# Altium footprint library PCB2-v2.PcbLib: 29 footprints (part 2 of 2)
Each footprint in its own frame and in the unit in brackets; x right, y up, seen from the top. Pads: shape width x height; smd on the part's side, far side on the other; paste and mask are expansions set on the pad; w line width, h text height; cw(c..) or ccw(c..) is an arc to the next point about the centre after c.
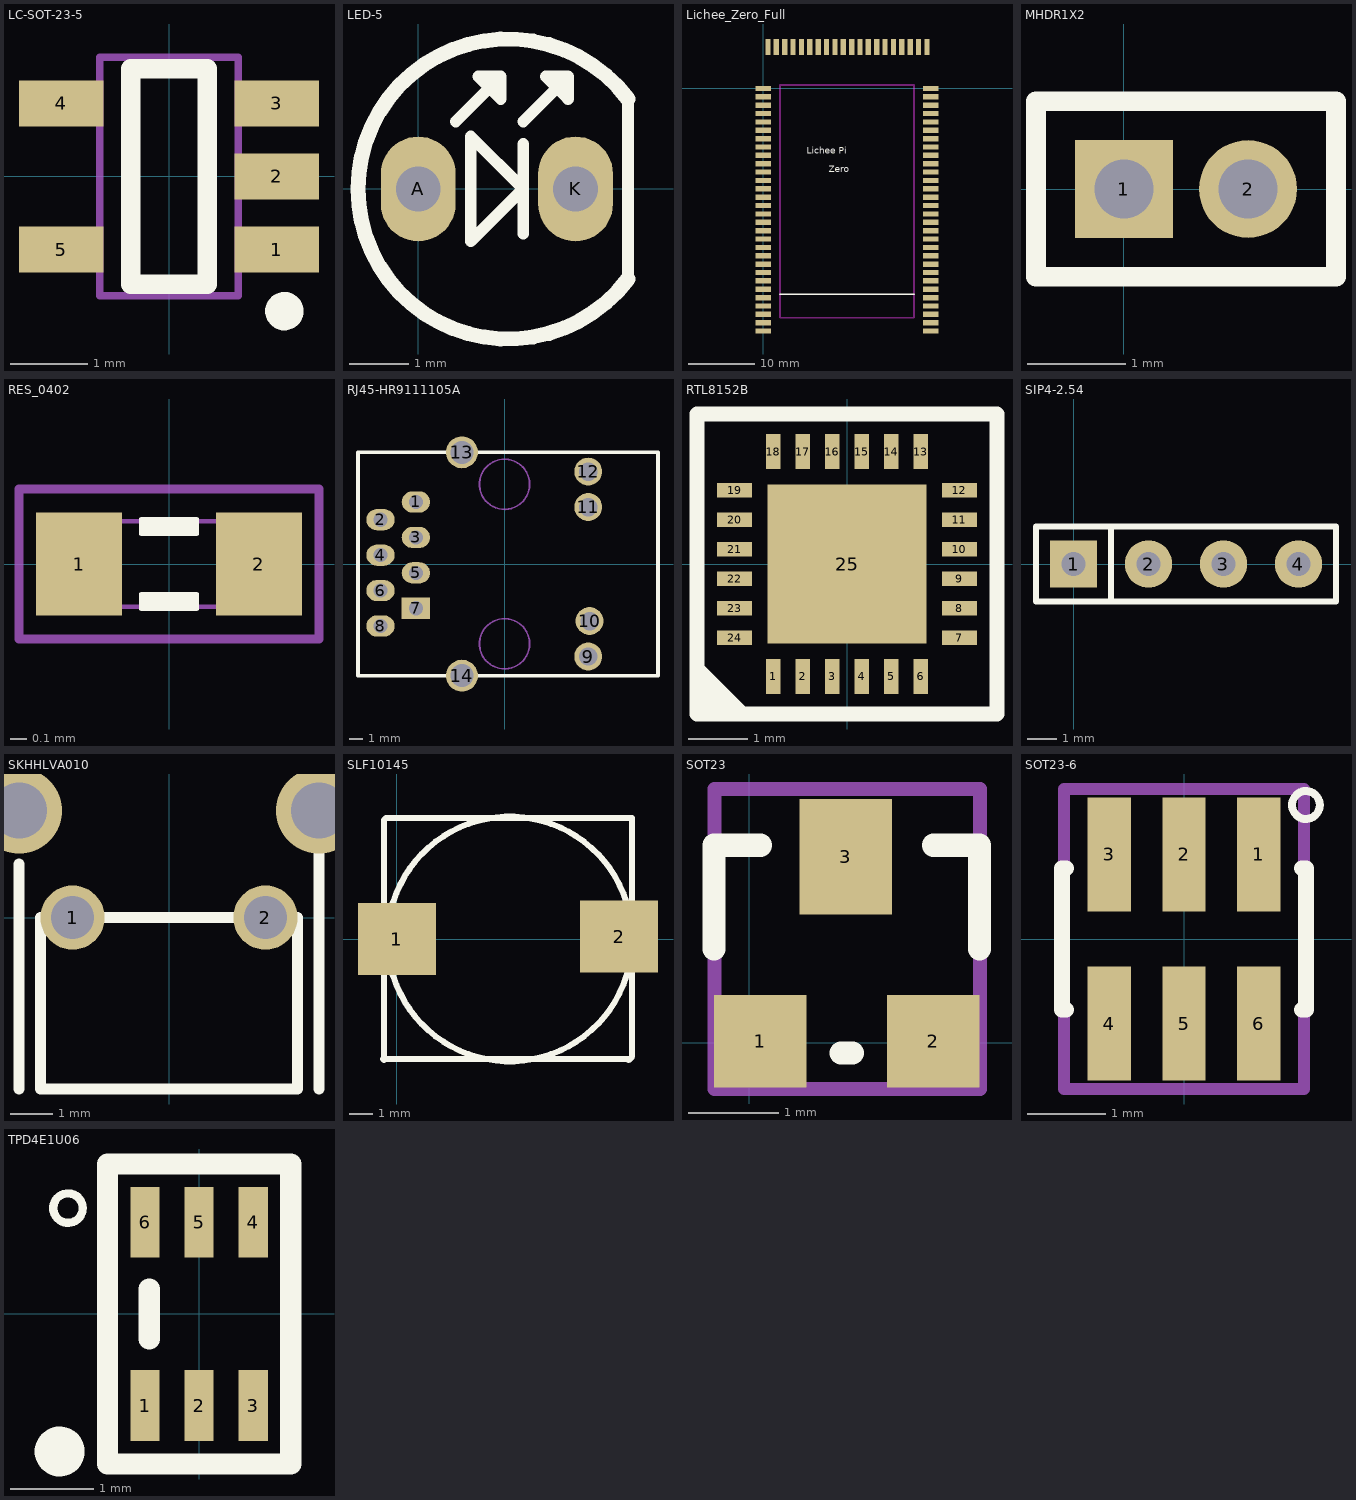
[diagram p1: the footprints below, top view; thin cyan lines are the x and y axes]

## LC-SOT-23-5 [mm]
pads (5):
  rect 1.1x0.6 smd: 1(1.4,-0.95) 2(1.4,0) 3(1.4,0.95) 4(-1.4,0.95) 5(-1.4,-0.95)
Top Overlay:
  circle w0.25: c1.5,-1.75 r0.125
  lines w0.254: -0.5,-1.4 -0.5,1.4 0.5,1.4 0.5,-1.4 -0.5,-1.4
Mechanical 13:
  lines w0.1: -0.9,-1.55 0.9,-1.55 0.9,1.55 -0.9,1.55 -0.9,-1.55

## LED-5 [mil]
pads (2):
  oval 50x70 hole 30: A(0,0) K(105,0)
Top Overlay:
  lines w7.78: 25,45 55,75 ; 70,-30 70,30 ; 70,45 100,75 ; 140,-60.15 140,60 ; 55,75 55,60 40,75 55,75 ; 100,75 100,60 85,75 100,75 ; 35,-35 35,35 70,0 35,-35
  lines w10: 140,-60.15 cw(c59.9,-0.07) 140,60

## Lichee_Zero_Full [mm]
height 1.12
pads (80):
  rect 2.4x0.8 smd: 1(0,0) 2(0,-1.27) 3(0,-2.54) 4(0,-3.81) 5(0,-5.08) 6(0,-6.35) 7(0,-7.62) 8(0,-8.89) 9(0,-10.16) 10(0,-11.43) 11(0,-12.7) 12(0,-13.97) 13(0,-15.24) 14(0,-16.51) 15(0,-17.78) 16(0,-19.05) 17(0,-20.32) 18(0,-21.59) 19(0,-22.86) 20(0,-24.13) 21(0,-25.4) 22(0,-26.67) 23(0,-27.94) 24(0,-29.21) 25(0,-30.48) 26(0,-31.75) 27(0,-33.02) 28(0,-34.29) 29(0,-35.56) 30(0,-36.83) 31(25.4,-36.83) 32(25.4,-35.56) 33(25.4,-34.29) 34(25.4,-33.02) 35(25.4,-31.75) 36(25.4,-30.48) 37(25.4,-29.21) 38(25.4,-27.94) 39(25.4,-26.67) 40(25.4,-25.4) 41(25.4,-24.13) 42(25.4,-22.86) 43(25.4,-21.59) 44(25.4,-20.32) 45(25.4,-19.05) 46(25.4,-17.78) 47(25.4,-16.51) 48(25.4,-15.24) 49(25.4,-13.97) 50(25.4,-12.7) 51(25.4,-11.43) 52(25.4,-10.16) 53(25.4,-8.89) 54(25.4,-7.62) 55(25.4,-6.35) 56(25.4,-5.08) 57(25.4,-3.81) 58(25.4,-2.54) 59(25.4,-1.27) 60(25.4,0)
  rect 0.8x2.4 smd: 61(24.834,6.3) 62(23.564,6.3) 63(22.294,6.3) 64(21.024,6.3) 65(19.754,6.3) 66(18.484,6.3) 67(17.214,6.3) 68(15.944,6.3) 69(14.674,6.3) 70(13.404,6.3) 71(12.134,6.3) 72(10.864,6.3) 73(9.594,6.3) 74(8.324,6.3) 75(7.054,6.3) 76(5.784,6.3) 77(4.514,6.3) 78(3.244,6.3) 79(1.974,6.3) 80(0.704,6.3)
Top Overlay:
  lines w0.254: 2.54,-31.242 22.86,-31.242
  text "Zero" at 9.906,-12.7 h1.02
  text "Lichee Pi" at 6.604,-9.906 h1.02
Keep-Out Layer:
  lines w0.254: 2.54,-34.798 2.54,0.508 22.86,0.508 22.86,-34.798 2.54,-34.798
3D body: height 5.55, standoff -2.17, extent 0,-39.647 25.552,6.35

## MHDR1X2 [mm] "Connector; Header; 2 Position"
pads (2):
  rect 1x1 hole 0.6: 1(0,0)
  round 1 hole 0.6: 2(1.27,0)
Top Overlay:
  lines w0.2: -0.9,-0.9 -0.9,0.9 2.17,0.9 2.17,-0.9 -0.9,-0.9

## RES_0402 [mil]
height 15.75
pads (2):
  rect 20x24 smd: 1(-21,0) 2(21,0)
Top Overlay:
  region: -6.5,10.5 6.5,10.5 6.5,7 -6.5,7
  region: 6.5,-10.5 -6.5,-10.5 -6.5,-7 6.5,-7
  lines w1: -6.5,-10.5 -6.5,-7 6.5,-7 6.5,-10.5 -6.5,-10.5 ; -6.5,7 6.5,7 6.5,10.5 -6.5,10.5 -6.5,7
Mechanical 13:
  lines w1: -12.8,-10 12.8,-10 ; -12.8,10 12.8,10 ; -20.67,-10.83 -20.67,10.83 -12.8,10.83 -12.8,-10.83 -20.67,-10.83 ; 12.8,-10.83 20.67,-10.83 20.67,10.83 12.8,10.83 12.8,-10.83
Mechanical 14:
  lines w2: -35,-17.5 -35,17.5 35,17.5 35,-17.5 -35,-17.5
3D body: height 15.75, standoff 0, extent -19.68,-9.84 19.69,9.85

## RJ45-HR9111105A [mm] "?"
height 0.762
pads (14):
  oval 2.032x1.524 hole 1.016: 1(-6.35,4.45) 2(-8.89,3.18) 3(-6.35,1.91) 4(-8.89,0.64) 5(-6.35,-0.63) 6(-8.89,-1.9) 8(-8.89,-4.44)
  rect 2.032x1.524 hole 1.016: 7(-6.35,-3.17)
  round 2 hole 1.32: 9(6,-6.625) 10(6.096,-4.085) 11(6,4.085) 12(6,6.625)
  round 2.286 hole 1.651: 13(-3.05,8.005) 14(-3.05,-7.995)
Top Overlay:
  lines w0.254: 6.854,8.005 6.858,8.001 ; -10.5,-8 11,-8 11,8 -10.5,8 -10.5,-8
Mechanical 1:
  circle w0.127: c0,5.715 r1.798
  circle w0.127: c0,-5.715 r1.798

## RTL8152B [mm]
height 0.7
pads (25):
  rect 0.25x0.6 smd: 1(-1.25,-1.905) 2(-0.75,-1.905) 3(-0.25,-1.905) 4(0.25,-1.905) 5(0.75,-1.905) 6(1.25,-1.905) 13(1.25,1.905) 14(0.75,1.905) 15(0.25,1.905) 16(-0.25,1.905) 17(-0.75,1.905) 18(-1.25,1.905)
  rect 0.6x0.25 smd: 7(1.905,-1.25) 8(1.905,-0.75) 9(1.905,-0.25) 10(1.905,0.25) 11(1.905,0.75) 12(1.905,1.25) 19(-1.905,1.25) 20(-1.905,0.75) 21(-1.905,0.25) 22(-1.905,-0.25) 23(-1.905,-0.75) 24(-1.905,-1.25)
  rect 2.7x2.7 smd paste+0: 25(0,0)
Top Overlay:
  lines w0.254: -2.54,-2.286 -2.286,-2.54 -2.032,-2.54 -2.54,-2.032 -2.54,-1.778 -1.778,-2.54 ; -2.54,1.778 -2.54,2.032 ; -2.286,2.54 -2.032,2.54 ; -2.54,-2.54 2.54,-2.54 2.54,2.54 -2.54,2.54 -2.54,-2.54
3D body: height 0.85, standoff 0, extent -2,-2 2,2

## SIP4-2.54 [mm]
pads (4):
  rect 1.6x1.6 hole 0.8: 1(0,0)
  round 1.6 hole 0.8: 2(2.54,0) 3(5.08,0) 4(7.62,0)
Top Overlay:
  lines w0.203: 1.27,-1.27 1.27,1.27 ; -1.27,-1.27 -1.27,1.27 8.89,1.27 8.89,-1.27 -1.27,-1.27

## SKHHLVA010 [mm]
pads (2):
  round 1.5 hole 1: 1(-2.25,0) 2(2.25,0)
via 3.5,2.5 diameter 2 hole 1.3
via -3.5,2.5 diameter 2 hole 1.3
Top Overlay:
  lines w0.254: -3.5,-4 -3.5,1.25 ; 3.5,-4 3.5,3 ; -3,-4 -3,0 3,0 3,-4 0,-4 -3,-4

## SLF10145 [mil]
pads (2):
  rect 130x120 smd: 1(0,0) 2(370.08,3.94)
Top Overlay:
  circle w10: c188.04,0 r204.01
  lines w10: -22.96,-200 385.04,-200 ; -21.96,-202 -21.96,0 ; -21.96,-12 -21.96,198 -17.96,202 392.04,202 392.04,-196 ; 392.04,-196 386.04,-202 392.04,-196

## SOT23 [mil]
pads (3):
  rect 40x40 smd: 1(4.88,0.63) 2(79.88,0.63)
  rect 40x50 smd: 3(41.88,80.63)
Top Overlay:
  lines w10: -15.12,40.63 -15.12,85.63 4.88,85.63 ; 39.88,-4.37 44.88,-4.37 ; 79.88,85.63 99.88,85.63 99.88,40.63
Mechanical 13:
  lines w6: -15,-20 -15,110 100,110 100,-20 -15,-20
3D body: height 47.24, standoff 0, extent -14.87,-11.02 99.3,99.22

## SOT23-6 [mm] "SOT-23/SC-74A; 5 Leads; Body 3.1 x 3 mm, inc. leads (LxW max)"
height 1.45
pads (6):
  rect 0.55x1.45 smd: 1(0.95,1.075) 2(0,1.075) 3(-0.95,1.075) 4(-0.95,-1.075) 5(0,-1.075) 6(0.95,-1.075)
Top Overlay:
  circle w0.1: c1.549,1.702 r0.177
  lines w0.2: -1.5,-0.9 -1.55,-0.9 -1.55,0.9 -1.5,0.9 ; 1.5,-0.9 1.55,-0.9 1.55,0.9 1.5,0.9
Mechanical 13:
  lines w0.152: -1.524,-1.905 1.524,-1.905 1.524,1.905 -1.524,1.905 -1.524,-1.905
3D body: height 1.08, standoff -0.01, extent -1.397,-1.194 1.397,1.232

## TPD4E1U06 [mm]
pads (6):
  rect 0.35x0.85 smd: 1(-0.65,-1.1) 2(0,-1.1) 3(0.65,-1.1) 4(0.65,1.1) 5(0,1.1) 6(-0.65,1.1)
Top Overlay:
  circle w0.1: c-1.574,1.27 r0.177
  circle w0.3: c-1.674,-1.651 r0.15
  lines w0.254: -0.6,-0.3 -0.6,0.3 ; -1.1,-1.8 -1.1,1.8 1.1,1.8 1.1,-1.8 -1.1,-1.8
3D body: height 1.1, standoff 0, extent -1.1,-0.7 1.1,0.7